# Altium footprint library texas.PCBLIB: 168 footprints (part 2 of 14)
Each footprint in its own frame and in the unit in brackets; x right, y up, seen from the top. Pads: shape width x height; smd on the part's side, far side on the other; paste and mask are expansions set on the pad; w line width, h text height; cw(c..) or ccw(c..) is an arc to the next point about the centre after c.
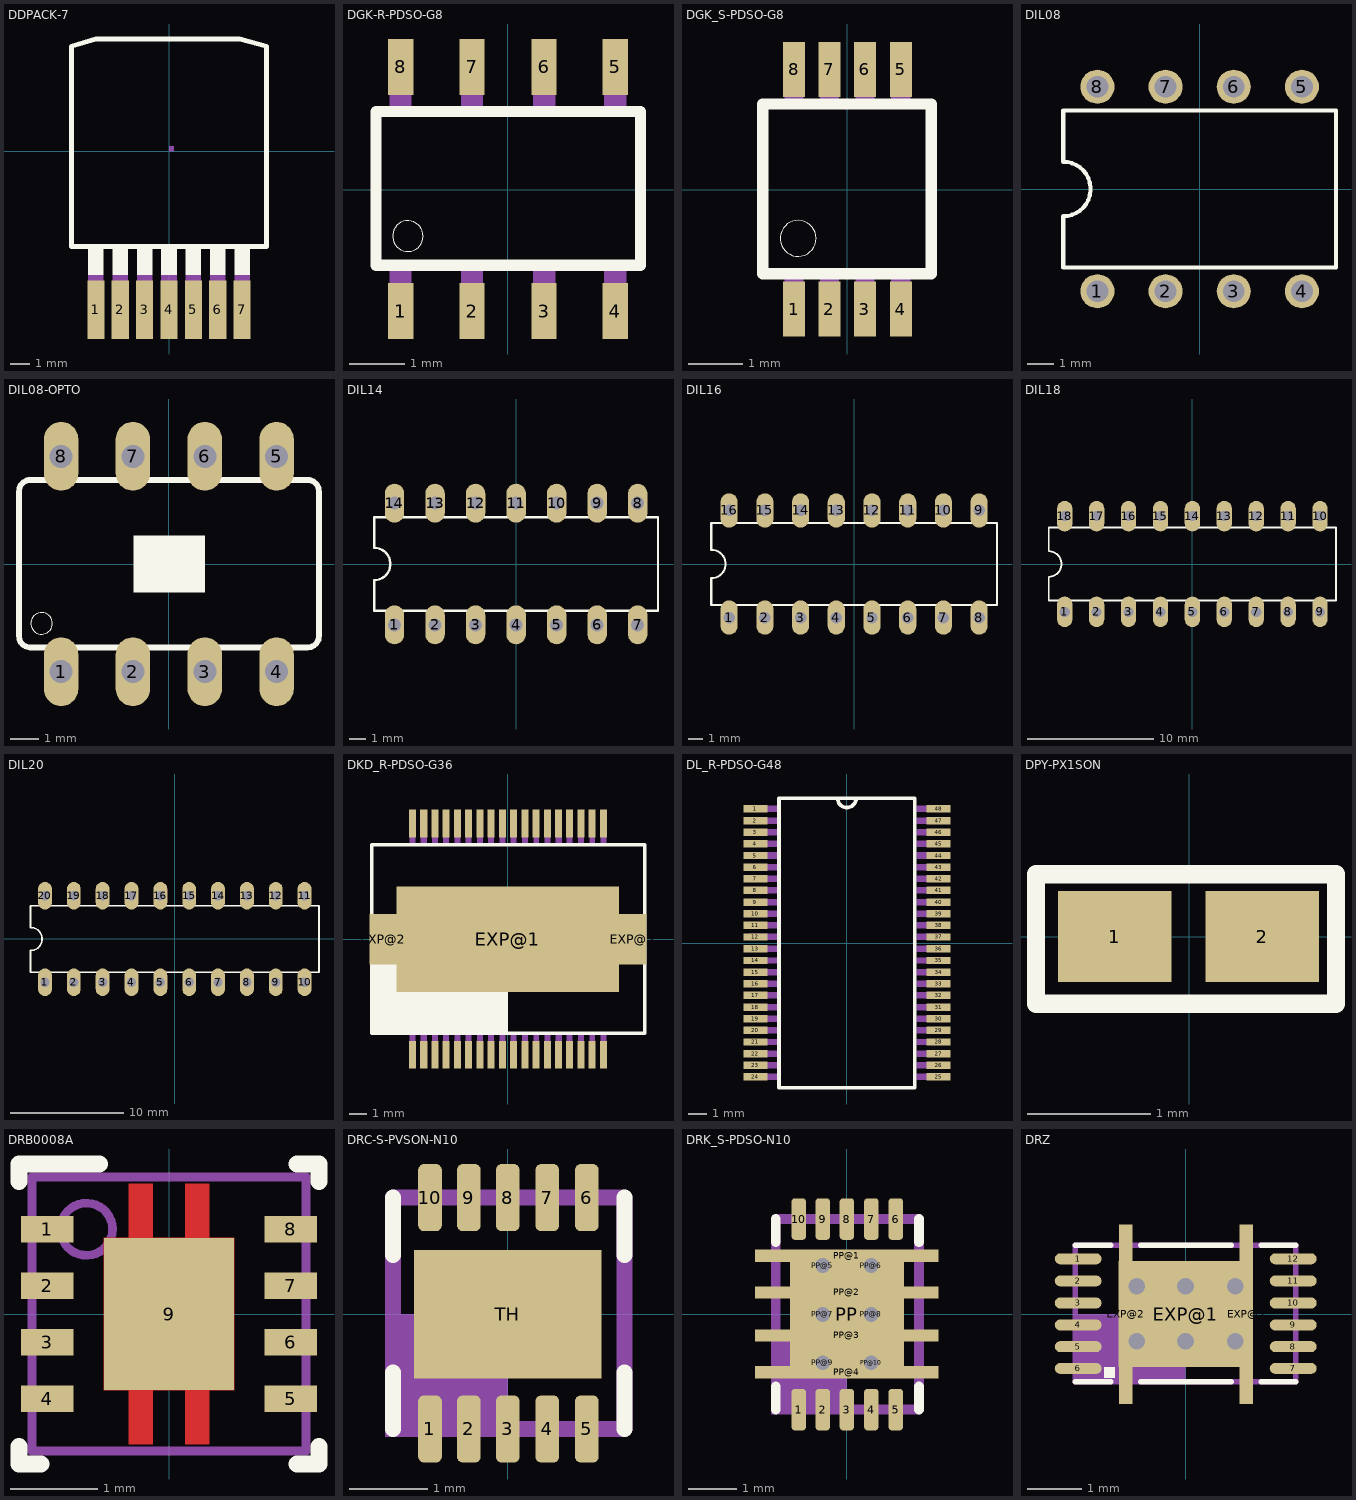
[diagram p1: the footprints below, top view; thin cyan lines are the x and y axes]

## DDPACK-7 [mil]
pads (7):
  rect 35x120 smd: 1(-150,-325) 2(-100,-325) 3(-50,-325) 4(0,-325) 5(50,-325) 6(100,-325) 7(150,-325)
Top Overlay:
  rectangle: 134,-254 166,-198
  rectangle: 84,-254 116,-198
  rectangle: 34,-254 66,-198
  rectangle: -16,-254 16,-198
  rectangle: -66,-254 -34,-198
  rectangle: -116,-254 -84,-198
  rectangle: -166,-254 -134,-198
  lines w10: -200,-195 200,-195 200,215 145,230 -150,230 -200,215 -200,-195
Mechanical 4:
  rectangle: 134,-372 166,-254
  rectangle: 84,-372 116,-254
  rectangle: 34,-372 66,-254
  rectangle: -16,-372 16,-254
  rectangle: -66,-372 -34,-254
  rectangle: -116,-372 -84,-254
  rectangle: -166,-372 -134,-254
Mechanical 14:
  region: 0,0 10,0 10,10 0,10

## DGK-R-PDSO-G8 [mil]
pads (8):
  rect 18x40 smd: 1(-76.77,-87.01) 2(-25.59,-87.01) 3(26,-87.01) 4(77,-87.01) 5(77,88) 6(26,88) 7(-25.59,88) 8(-76.77,88)
Top Overlay:
  circle w0: c-71.65,-33.27 r11
  lines w8: 95,55 95,-54.13 -94.49,-54.13 -94.49,56 95,56
Mechanical 4:
  rectangle: -84.65,-100.39 -68.9,-56.3
  rectangle: -33.46,-100.39 -17.72,-56.3
  rectangle: 18,-100.39 34,-56.3
  rectangle: 69,-100.39 85,-56.3
  region: 85,101 69,101 69,57 85,57
  region: 34,101 18,101 18,57 34,57
  region: -17.72,101 -33.46,101 -33.46,57 -17.72,57
  region: -68.9,101 -84.65,101 -84.65,57 -68.9,57

## DGK_S-PDSO-G8 [mil]
pads (8):
  rect 16x40 smd: 1(-38.39,-86.61) 2(-12.8,-86.61) 3(13,-86.61) 4(39,-86.61) 5(39,87) 6(13,87) 7(-12.8,87) 8(-38.39,87)
Top Overlay:
  circle w0: c-35.43,-35.43 r13
  lines w8: -61.02,-61.02 -61.02,62 61,62 61,-61.02 -61.02,-61.02
Top Solder:
  region: -29.53,109 -47.24,109 -47.24,65 -29.53,65
  region: -3.94,109 -21.65,109 -21.65,65 -3.94,65
  region: 22,109 4,109 4,65 22,65
  region: 48,109 30,109 30,65 48,65
  rectangle: 30,-108.27 48,-64.96
  rectangle: 4,-108.27 22,-64.96
  rectangle: -21.65,-108.27 -3.94,-64.96
  rectangle: -47.24,-108.27 -29.53,-64.96
Mechanical 4:
  region: -31.5,99 -45.28,99 -45.28,64 -31.5,64
  region: -5.91,99 -19.68,99 -19.69,64 -5.91,64
  region: 20,99 6,99 6,64 20,64
  region: 46,99 32,99 32,64 46,64
  rectangle: 32,-98.43 46,-63.98
  rectangle: 6,-98.43 20,-63.98
  rectangle: -19.68,-98.43 -5.91,-63.98
  rectangle: -45.28,-98.43 -31.5,-63.98

## DIL08 [mil]
pads (8):
  round 50 hole 32: 1(-150,-150) 2(-50,-150) 3(50,-150) 4(150,-150) 5(150,150) 6(50,150) 7(-50,150) 8(-150,150)
Top Overlay:
  lines w6: -200,-115 -200,-40 ccw(c-200,0) -200,40 -200,115 200,115 200,-115 -200,-115

## DIL08-OPTO [mil]
pads (8):
  oval 48x96 hole 32: 1(-150,-150) 2(-50,-150) 3(50,-150) 4(150,-150) 5(150,150) 6(50,150) 7(-50,150) 8(-150,150)
Top Overlay:
  circle w0: c-177.17,-82.68 r15
  circle w0: c0,-1.97 r1
  rectangle: -49.21,-39.37 50,40
  lines w8: -208.66,-100.39 ccw(c-192.91,-100.39) -192.91,-116.14 193,-116.14 ccw(c193.13,-100.27) 209,-100.39 209,101 ccw(c193,101) 193,117 -192.91,117 ccw(c-192.79,101.13) -208.66,101 -208.66,-100.39

## DIL14 [mil]
pads (14):
  oval 48x96 hole 32: 1(-300,-150) 2(-200,-150) 3(-100,-150) 4(0,-150) 5(100,-150) 6(200,-150) 7(300,-150) 8(300,150) 9(200,150) 10(100,150) 11(0,150) 12(-100,150) 13(-200,150) 14(-300,150)
Top Overlay:
  lines w6: -350,-115 -350,-40 ccw(c-350,0) -350,40 -350,115 350,115 350,-115 -350,-115

## DIL16 [mil]
pads (16):
  oval 48x96 hole 32: 1(-350,-150) 2(-250,-150) 3(-150,-150) 4(-50,-150) 5(50,-150) 6(150,-150) 7(250,-150) 8(350,-150) 9(350,150) 10(250,150) 11(150,150) 12(50,150) 13(-50,150) 14(-150,150) 15(-250,150) 16(-350,150)
Top Overlay:
  lines w6: -400,-115 400,-115 400,115 -400,115 -400,40 cw(c-400,0) -400,-40 -400,-115
3D body "SW3DPS-DIP16-DEFAULT.STEP": height 165, standoff -101, extent -425,-155 425,155

## DIL18 [mil]
pads (18):
  oval 48x96 hole 32: 1(-400,-150) 2(-300,-150) 3(-200,-150) 4(-100,-150) 5(0,-150) 6(100,-150) 7(200,-150) 8(300,-150) 9(400,-150) 10(400,150) 11(300,150) 12(200,150) 13(100,150) 14(0,150) 15(-100,150) 16(-200,150) 17(-300,150) 18(-400,150)
Top Overlay:
  lines w6: -450,-115 -450,-40 ccw(c-450,0) -450,40 -450,115 450,115 450,-115 -450,-115

## DIL20 [mil]
pads (20):
  oval 48x96 hole 32: 1(-450,-150) 2(-350,-150) 3(-250,-150) 4(-150,-150) 5(-50,-150) 6(50,-150) 7(150,-150) 8(250,-150) 9(350,-150) 10(450,-150) 11(450,150) 12(350,150) 13(250,150) 14(150,150) 15(50,150) 16(-50,150) 17(-150,150) 18(-250,150) 19(-350,150) 20(-450,150)
Top Overlay:
  lines w6: -500,-115 500,-115 500,115 -500,115 -500,40 cw(c-500,0) -500,-40 -500,-115

## DKD_R-PDSO-G36 [mil]
pads (39):
  rect 16x63 smd: 1(-217.52,-263.78) 2(-191.93,-263.78) 3(-166.34,-263.78) 4(-140.75,-263.78) 5(-115.16,-263.78) 6(-89.57,-263.78) 7(-63.98,-263.78) 8(-38.39,-263.78) 9(-12.8,-263.78) 10(13,-263.78) 11(39,-263.78) 12(64,-263.78) 13(90,-263.78) 14(116,-263.78) 15(141,-263.78) 16(167,-263.78) 17(192,-263.78) 18(218,-263.78) 19(218,264) 20(192,264) 21(167,264) 22(141,264) 23(116,264) 24(90,264) 25(64,264) 26(39,264) 27(13,264) 28(-12.8,264) 29(-38.39,264) 30(-63.98,264) 31(-89.57,264) 32(-115.16,264) 33(-140.75,264) 34(-166.34,264) 35(-191.93,264) 36(-217.52,264)
  rect 508x241 smd: EXP@1(0,0)
  rect 63x115 smd: EXP@2(-284.45,0) EXP@3(285,0)
Top Overlay:
  rectangle: -311.02,-213.58 0,0
  lines w8: -311.02,-214.57 312,-214.57 312,215 -311.02,215 -311.02,-214.57
Top Solder:
  rectangle: -227.36,-297.24 -207.68,-230.31
  rectangle: -201.77,-297.24 -182.09,-230.31
  rectangle: -176.18,-297.24 -156.5,-230.31
  rectangle: -150.59,-297.24 -130.91,-230.31
  rectangle: -125,-297.24 -105.31,-230.31
  rectangle: -99.41,-297.24 -79.72,-230.31
  rectangle: -73.82,-297.24 -54.13,-230.31
  rectangle: -48.23,-297.24 -28.54,-230.31
  rectangle: -22.64,-297.24 -2.95,-230.31
  rectangle: 3,-297.24 23,-230.31
  rectangle: 29,-297.24 49,-230.31
  rectangle: 55,-297.24 74,-230.31
  rectangle: 80,-297.24 100,-230.31
  rectangle: 106,-297.24 125,-230.31
  rectangle: 131,-297.24 151,-230.31
  rectangle: 157,-297.24 177,-230.31
  rectangle: 183,-297.24 202,-230.31
  rectangle: 208,-297.24 228,-230.31
  region: 228,298 208,298 208,231 228,231
  region: 202,298 183,298 183,231 202,231
  region: 177,298 157,298 157,231 177,231
  region: 151,298 131,298 131,231 151,231
  region: 125,298 106,298 106,231 125,231
  region: 100,298 80,298 80,231 100,231
  region: 74,298 55,298 55,231 74,231
  region: 49,298 29,298 29,231 49,231
  region: 23,298 3,298 3,231 23,231
  region: -2.95,298 -22.64,298 -22.64,231 -2.95,231
  region: -28.54,298 -48.23,298 -48.23,231 -28.54,231
  region: -54.13,298 -73.82,298 -73.82,231 -54.13,231
  region: -79.72,298 -99.41,298 -99.41,231 -79.72,231
  region: -105.31,298 -125,298 -125,231 -105.31,231
  region: -130.91,298 -150.59,298 -150.59,231 -130.91,231
  region: -156.5,298 -176.18,298 -176.18,231 -156.5,231
  region: -182.09,298 -201.77,298 -201.77,231 -182.09,231
  region: -207.68,298 -227.36,298 -227.36,231 -207.68,231
Mechanical 4:
  rectangle: -224.41,-285.43 -210.63,-217.52
  rectangle: -198.82,-285.43 -185.04,-217.52
  rectangle: -173.23,-285.43 -159.45,-217.52
  rectangle: -147.64,-285.43 -133.86,-217.52
  rectangle: -122.05,-285.43 -108.27,-217.52
  rectangle: -96.46,-285.43 -82.68,-217.52
  rectangle: -70.87,-285.43 -57.09,-217.52
  rectangle: -45.28,-285.43 -31.5,-217.52
  rectangle: -19.68,-285.43 -5.91,-217.52
  rectangle: 6,-285.43 20,-217.52
  rectangle: 32,-285.43 46,-217.52
  rectangle: 58,-285.43 71,-217.52
  rectangle: 83,-285.43 97,-217.52
  rectangle: 109,-285.43 123,-217.52
  rectangle: 134,-285.43 148,-217.52
  rectangle: 160,-285.43 174,-217.52
  rectangle: 186,-285.43 199,-217.52
  rectangle: 211,-285.43 225,-217.52
  region: -82.68,286 -96.46,286 -96.46,218 -82.68,218
  region: -108.27,286 -122.05,286 -122.05,218 -108.27,218
  region: -133.86,286 -147.64,286 -147.64,218 -133.86,218
  region: -159.45,286 -173.23,286 -173.23,218 -159.45,218
  region: -185.04,286 -198.82,286 -198.82,218 -185.04,218
  region: -210.63,286 -224.41,286 -224.41,218 -210.63,218
  region: 71,286 58,286 58,218 71,218
  region: 46,286 32,286 32,218 46,218
  region: 20,286 6,286 6,218 20,218
  region: -5.91,286 -19.68,286 -19.69,218 -5.91,218
  region: -31.5,286 -45.28,286 -45.28,218 -31.5,218
  region: -57.09,286 -70.87,286 -70.87,218 -57.09,218
  region: 225,286 211,286 211,218 225,218
  region: 199,286 186,286 186,218 199,218
  region: 174,286 160,286 160,218 174,218
  region: 148,286 134,286 134,218 148,218
  region: 123,286 109,286 109,218 123,218
  region: 97,286 83,286 83,218 97,218

## DL_R-PDSO-G48 [mil]
pads (48):
  rect 52x16 smd: 1(-196.06,288) 2(-196.06,263) 3(-196.06,238) 4(-196.06,213) 5(-196.06,188) 6(-196.06,163) 7(-196.06,138) 8(-196.06,113) 9(-196.06,88) 10(-196.06,63) 11(-196.06,38) 12(-196.06,13) 13(-196.06,-12.5) 14(-196.06,-37.5) 15(-196.06,-62.5) 16(-196.06,-87.5) 17(-196.06,-112.5) 18(-196.06,-137.5) 19(-196.06,-162.5) 20(-196.06,-187.5) 21(-196.06,-212.5) 22(-196.06,-237.5) 23(-196.06,-262.5) 24(-196.06,-287.5) 25(197,-287.5) 26(197,-262.5) 27(197,-237.5) 28(197,-212.5) 29(197,-187.5) 30(197,-162.5) 31(197,-137.5) 32(197,-112.5) 33(197,-87.5) 34(197,-62.5) 35(197,-37.5) 36(197,-12.5) 37(197,13) 38(197,38) 39(197,63) 40(197,88) 41(197,113) 42(197,138) 43(197,163) 44(197,188) 45(197,213) 46(197,238) 47(197,263) 48(197,288)
Top Overlay:
  lines w8: -19.69,311 ccw(c0.16,311) 20,311 ; -145.61,-310.96 146,-310.96 146,311 -145.61,311 -145.61,-310.96
Mechanical 4:
  rectangle: -209.84,281 -149.61,295
  rectangle: -209.84,256 -149.61,270
  rectangle: -209.84,231 -149.61,245
  rectangle: -209.84,206 -149.61,220
  rectangle: -209.84,181 -149.61,195
  rectangle: -209.84,156 -149.61,170
  rectangle: -209.84,131 -149.61,145
  rectangle: -209.84,106 -149.61,120
  rectangle: -209.84,81 -149.61,95
  rectangle: -209.84,56 -149.61,70
  rectangle: -209.84,31 -149.61,45
  rectangle: -209.84,6 -149.61,20
  rectangle: -209.84,-19.39 -149.61,-5.61
  rectangle: -209.84,-44.39 -149.61,-30.61
  rectangle: -209.84,-69.39 -149.61,-55.61
  rectangle: -209.84,-94.39 -149.61,-80.61
  rectangle: -209.84,-119.39 -149.61,-105.61
  rectangle: -209.84,-144.39 -149.61,-130.61
  rectangle: -209.84,-169.39 -149.61,-155.61
  rectangle: -209.84,-194.39 -149.61,-180.61
  rectangle: -209.84,-219.39 -149.61,-205.61
  rectangle: -209.84,-244.39 -149.61,-230.61
  rectangle: -209.84,-269.39 -149.61,-255.61
  rectangle: -209.84,-294.39 -149.61,-280.61
  rectangle: 150,-294.39 210,-280.61
  rectangle: 150,-269.39 210,-255.61
  rectangle: 150,-244.39 210,-230.61
  rectangle: 150,-219.39 210,-205.61
  rectangle: 150,-194.39 210,-180.61
  rectangle: 150,-169.39 210,-155.61
  rectangle: 150,-144.39 210,-130.61
  rectangle: 150,-119.39 210,-105.61
  rectangle: 150,-94.39 210,-80.61
  rectangle: 150,-69.39 210,-55.61
  rectangle: 150,-44.39 210,-30.61
  rectangle: 150,-19.39 210,-5.61
  rectangle: 150,6 210,20
  rectangle: 150,31 210,45
  rectangle: 150,56 210,70
  rectangle: 150,81 210,95
  rectangle: 150,106 210,120
  rectangle: 150,131 210,145
  rectangle: 150,156 210,170
  rectangle: 150,181 210,195
  rectangle: 150,206 210,220
  rectangle: 150,231 210,245
  rectangle: 150,256 210,270
  rectangle: 150,281 210,295

## DPY-PX1SON [mm]
pads (2):
  rect 0.925x0.74 smd: 1(-0.605,0) 2(0.595,0)
Top Overlay:
  lines w0.15: -1.245,-0.547 -1.245,0.508 1.194,0.508 1.194,-0.547 0.127,-0.547 -1.245,-0.547
3D body "User Library-R_0402.step": height 0.35, standoff 0, extent -0.5,-0.25 0.5,0.25

## DRB0008A [mm]
pads (9):
  rect 0.6x0.3 smd paste+0 mask+0.051: 1(-1.4,0.975) 2(-1.4,0.325) 3(-1.4,-0.325) 4(-1.4,-0.975) 5(1.4,-0.975) 6(1.4,-0.325) 7(1.4,0.325) 8(1.4,0.975)
  rect 1.5x1.75 smd paste-0.862 mask+0.051: 9(0,0)
Top Layer:
  region: -0.185,-1.5 -0.465,-1.5 -0.465,-0.875 -0.75,-0.875 -0.75,0.875 -0.465,0.875 -0.465,1.5 -0.185,1.5 -0.185,0.875 0.185,0.875 0.185,1.5 0.465,1.5 0.465,0.875 0.75,0.875 0.75,-0.875 0.465,-0.875 0.465,-1.5 0.185,-1.5 0.185,-0.875 -0.185,-0.875
Top Overlay:
  lines w0.2: -1.725,-1.525 -1.725,-1.725 -1.475,-1.725 ; -1.725,1.525 -1.725,1.725 -0.8,1.725 ; 1.475,-1.725 1.725,-1.725 1.725,-1.525 ; 1.475,1.725 1.725,1.725 1.725,1.525
Top Paste:
  region: -0.691,0.793 -0.691,-0.793 0.692,-0.793 0.692,0.793
Top Solder:
  region: -0.185,-1.551 -0.465,-1.551 -0.475,-1.55 -0.484,-1.547 -0.493,-1.542 -0.501,-1.536 -0.507,-1.528 -0.512,-1.519 -0.515,-1.51 -0.516,-1.5 -0.516,-0.926 -0.75,-0.926 -0.76,-0.925 -0.769,-0.922 -0.778,-0.917 -0.786,-0.911 -0.792,-0.903 -0.797,-0.894 -0.8,-0.885 -0.801,-0.875 -0.801,0.875 -0.8,0.885 -0.797,0.894 -0.792,0.903 -0.786,0.911 -0.778,0.917 -0.769,0.922 -0.76,0.925 -0.75,0.926 -0.516,0.926 -0.516,1.5 -0.515,1.51 -0.512,1.519 -0.507,1.528 -0.501,1.536 -0.493,1.542 -0.484,1.547 -0.475,1.55 -0.465,1.551 -0.185,1.551 -0.175,1.55 -0.166,1.547 -0.157,1.542 -0.149,1.536 -0.143,1.528 -0.138,1.519 -0.135,1.51 -0.134,1.5 -0.134,0.926 0.134,0.926 0.134,1.5 0.135,1.51 0.138,1.519 0.143,1.528 0.149,1.536 0.157,1.542 0.166,1.547 0.175,1.55 0.185,1.551 0.465,1.551 0.475,1.55 0.484,1.547 0.493,1.542 0.501,1.536 0.507,1.528 0.512,1.519 0.515,1.51 0.516,1.5 0.516,0.926 0.75,0.926 0.76,0.925 0.769,0.922 0.778,0.917 0.786,0.911 0.792,0.903 0.797,0.894 0.8,0.885 0.801,0.875 0.801,-0.875 0.8,-0.885 0.797,-0.894 0.792,-0.903 0.786,-0.911 0.778,-0.917 0.769,-0.922 0.76,-0.925 0.75,-0.926 0.516,-0.926 0.516,-1.5 0.515,-1.51 0.512,-1.519 0.507,-1.528 0.501,-1.536 0.493,-1.542 0.484,-1.547 0.475,-1.55 0.465,-1.551 0.185,-1.551 0.175,-1.55 0.166,-1.547 0.157,-1.542 0.149,-1.536 0.143,-1.528 0.138,-1.519 0.135,-1.51 0.134,-1.5 0.134,-0.926 -0.134,-0.926 -0.134,-1.5 -0.135,-1.51 -0.138,-1.519 -0.143,-1.528 -0.149,-1.536 -0.157,-1.542 -0.166,-1.547 -0.175,-1.55
Mechanical 13:
  circle w0.1: c-0.95,0.975 r0.3
  lines w0.1: -1.575,-1.575 1.575,-1.575 1.575,1.575 -1.575,1.575 -1.575,-1.575
3D body: height 0.25, standoff 0, extent 0,0 0.254,0.254
3D body "User Library-DRB(S-PVSON-N8).STEP": height 1, standoff -0.05, extent -1.52,-1.524 1.52,1.516

## DRC-S-PVSON-N10 [mil]
pads (11):
  rrect50% 12x34 smd: 1(-39.37,-58.07) 2(-19.68,-58.07) 3(0,-58.07) 4(20,-58.07) 5(40,-58.07) 6(40,59) 7(20,59) 8(0,59) 9(-19.68,59) 10(-39.37,59)
  rect 95x65 smd: TH(0,0)
Top Layer:
  region: 0,0 10,0 10,10 0,10
Top Overlay:
  lines w8: -58.07,-58.07 -58.07,-29.43 ; -58.07,30 -58.07,59 ; 59,-58.07 59,-29.43 ; 59,30 59,59
Top Paste:
  circle w0: c-39.37,46 r5
  circle w0: c-19.68,46 r5
  circle w0: c0,46 r5
  circle w0: c20,46 r5
  circle w0: c40,46 r5
  circle w0: c40,-45.87 r5
  circle w0: c20,-45.87 r5
  circle w0: c0,-45.87 r5
  circle w0: c-19.68,-45.87 r5
  circle w0: c-39.37,-45.87 r5
  region: 75,16 53,16 53,6 75,6
  region: 75,-5.91 53,-5.91 53,-15.75 75,-15.75
  region: -43.87,72.98 -43.87,46.02 -34.87,46.02 -34.87,72.98
  region: -24.19,72.98 -24.19,46.02 -15.19,46.02 -15.19,72.98
  region: -4.24,73.24 -4.24,45.76 4.76,45.76 4.76,73.24
  region: 16,73 16,46 25,46 25,73
  region: 35,73 35,46 44,46 44,73
  region: 44.03,-72.85 44.03,-45.85 34.97,-45.85 34.97,-72.85
  region: 25.03,-72.85 25.03,-45.85 15.97,-45.85 15.97,-72.85
  region: 4.79,-73.09 4.79,-45.61 -4.27,-45.61 -4.27,-73.09
  region: -15.16,-72.83 -15.16,-45.87 -24.21,-45.87 -24.21,-72.83
  region: -34.84,-72.83 -34.84,-45.87 -43.9,-45.87 -43.9,-72.83
  region: 47,32 6,32 6,6 47,6
  region: 47,-5.91 6,-5.91 6,-31.5 47,-31.5
  rectangle: -46.26,-31.5 -5.91,-5.91
  rectangle: -46.26,6 -5.91,32
  rectangle: -74.8,-15.75 -52.17,-5.91
  rectangle: -74.8,6 -52.17,16
Top Solder:
  circle w0: c-39.37,46 r7
  circle w0: c-19.68,46 r7
  circle w0: c0,46 r7
  circle w0: c20,46 r7
  circle w0: c40,46 r7
  circle w0: c40,-45.87 r7
  circle w0: c20,-45.87 r7
  circle w0: c0,-45.87 r7
  circle w0: c-19.68,-45.87 r7
  circle w0: c-39.37,-45.87 r7
  region: 76,17 53,17 53,5 76,5
  region: 76,-4.92 53,-4.92 53,-16.73 76,-16.73
  region: -32.48,76 -46.26,76 -46.26,46 -32.48,46
  region: -12.8,76 -26.57,76 -26.57,46 -12.8,46
  region: 7,76 -6.89,76 -6.89,46 7,46
  region: 27,76 13,76 13,46 27,46
  region: 47,76 33,76 33,46 47,46
  rectangle: 33,-75.79 47,-45.87
  rectangle: 13,-75.79 27,-45.87
  rectangle: -6.89,-75.79 7,-45.87
  rectangle: -26.57,-75.79 -12.8,-45.87
  rectangle: -46.26,-75.79 -32.48,-45.87
  rectangle: -48.23,-33.46 49,34
  rectangle: -75.79,-16.73 -52.17,-4.92
  rectangle: -75.79,5 -52.17,17
Mechanical 4:
  rectangle: -62.01,-62.01 0,0
  lines w8: -58.07,-58.07 -58.07,59 59,59 59,-58.07 -58.07,-58.07

## DRK_S-PDSO-N10 [mil]
pads (21):
  rrect50% 12x34 smd: 1(-39.37,-77.76) 2(-19.68,-77.76) 3(0,-77.76) 4(20,-77.76) 5(40,-77.76) 6(40,78) 7(20,78) 8(0,78) 9(-19.68,78) 10(-39.37,78)
  rect 93x105 smd: PP(0,0)
  rect 150x10 smd: PP@1(0,48) PP@2(0,18) PP@3(0,-17.13) PP@4(0,-47.24)
  round 20 hole 12: PP@5(-19.68,40) PP@6(20,40) PP@7(-19.68,0) PP@8(20,0) PP@9(-19.68,-39.37) PP@10(20,-39.37)
Top Overlay:
  lines w8: -58.07,-77.76 -58.07,-58.96 ; -58.07,59 -58.07,78 ; 59,-77.76 59,-58.96 ; 59,59 59,78
Top Paste:
  circle w0: c-39.37,66 r5
  circle w0: c-19.68,66 r5
  circle w0: c0,66 r5
  circle w0: c20,66 r5
  circle w0: c40,66 r5
  circle w0: c40,-65.55 r5
  circle w0: c20,-65.55 r5
  circle w0: c0,-65.55 r5
  circle w0: c-19.68,-65.55 r5
  circle w0: c-39.37,-65.55 r5
  region: -3.94,-3.94 -39.37,-3.94 -39.37,-51.18 -3.94,-51.18
  rectangle: 4,4 40,52
  region: 40,-3.94 4,-3.94 4,-51.18 40,-51.18
  region: 75,22 53,22 53,13 75,13
  region: 75,53 53,53 53,43 75,43
  region: 75,-12.8 53,-12.8 53,-21.65 75,-21.65
  region: 75,-42.32 53,-42.32 53,-52.17 75,-52.17
  rectangle: -74.8,-21.65 -52.17,-12.8
  rectangle: -74.8,-52.17 -52.17,-42.32
  region: -43.87,92.98 -43.87,66.02 -34.87,66.02 -34.87,92.98
  region: -24.19,92.98 -24.19,66.02 -15.19,66.02 -15.19,92.98
  region: -4.24,93.24 -4.24,65.76 4.76,65.76 4.76,93.24
  region: 16,93 16,66 25,66 25,93
  region: 35,93 35,66 44,66 44,93
  region: 44.03,-92.54 44.03,-65.54 34.97,-65.54 34.97,-92.54
  region: 25.03,-92.54 25.03,-65.54 15.97,-65.54 15.97,-92.54
  region: 4.79,-92.78 4.79,-65.29 -4.27,-65.29 -4.27,-92.78
  region: -15.16,-92.52 -15.16,-65.55 -24.21,-65.55 -24.21,-92.52
  region: -34.84,-92.52 -34.84,-65.55 -43.9,-65.55 -43.9,-92.52
  rectangle: -39.37,4 -3.94,52
  rectangle: -74.8,13 -52.17,22
  rectangle: -74.8,43 -52.17,53
Top Solder:
  circle w0: c-39.37,66 r7
  circle w0: c-19.68,66 r7
  circle w0: c0,66 r7
  circle w0: c20,66 r7
  circle w0: c40,66 r7
  circle w0: c40,-65.55 r7
  circle w0: c20,-65.55 r7
  circle w0: c0,-65.55 r7
  circle w0: c-19.68,-65.55 r7
  circle w0: c-39.37,-65.55 r7
  region: 76,24 47,24 47,11 76,11
  region: 76,54 47,54 47,42 76,42
  region: 76,-10.83 47,-10.83 47,-23.62 76,-23.62
  region: 76,-41.34 47,-41.34 47,-53.15 76,-53.15
  rectangle: -75.79,-23.62 -46.26,-10.83
  rectangle: -75.79,-53.15 -46.26,-41.34
  region: -32.48,96 -46.26,96 -46.26,66 -32.48,66
  region: -12.8,96 -26.57,96 -26.57,66 -12.8,66
  region: 7,96 -6.89,96 -6.89,66 7,66
  region: 27,96 13,96 13,66 27,66
  region: 47,96 33,96 33,66 47,66
  rectangle: 33,-95.47 47,-65.55
  rectangle: 13,-95.47 27,-65.55
  rectangle: -6.89,-95.47 7,-65.55
  rectangle: -26.57,-95.47 -12.8,-65.55
  rectangle: -46.26,-95.47 -32.48,-65.55
  rectangle: -48.23,-54.13 49,55
  rectangle: -75.79,11 -46.26,24
  rectangle: -75.79,42 -46.26,54
Mechanical 4:
  rectangle: -62.01,-81.69 0,-19.68
  lines w8: -58.07,-77.76 -58.07,78 59,78 59,-77.76 -58.07,-77.76

## DRZ [mil]
pads (21):
  rrect100% 34x8 smd: 1(-77.76,40) 2(-77.76,24) 3(-77.76,8) 4(-77.76,-7.87) 5(-77.76,-23.62) 6(-77.76,-39.37) 7(78,-39.37) 8(78,-23.62) 9(78,-7.87) 10(78,8) 11(78,24) 12(78,40)
  rect 97x77 smd: EXP@1(0,0)
  rect 10x130 smd: EXP@2(-43.31,0) EXP@3(44,0)
  round 16 hole 12: EXP@4(-35.43,20) EXP@5(0,20) EXP@6(36,20) EXP@7(-35.43,-19.68) EXP@8(0,-19.68) EXP@9(36,-19.68)
Top Overlay:
  rectangle: -59.06,-46.26 -51.18,-38.39
  lines w4: -79.72,-49.21 -54.13,-49.21 ; -79.72,50 -54.13,50 ; -32.48,-49.21 33,-49.21 ; -32.48,50 33,50 ; 55,-49.21 80,-49.21 ; 55,50 80,50
Top Paste:
  circle w0: c-64.96,40 r3
  circle w0: c-64.96,24 r3
  circle w0: c-64.96,8 r3
  circle w0: c-64.96,-7.87 r3
  circle w0: c-64.96,-23.62 r3
  circle w0: c-64.96,-39.37 r3
  circle w0: c65,-39.37 r3
  circle w0: c65,-23.62 r3
  circle w0: c65,-7.87 r3
  circle w0: c65,8 r3
  circle w0: c65,24 r3
  circle w0: c65,40 r3
  rectangle: -91.54,37 -64.96,43
  rectangle: -91.54,21 -64.96,27
  rectangle: -91.54,5 -64.96,11
  rectangle: -91.54,-10.83 -64.96,-4.92
  rectangle: -91.54,-26.57 -64.96,-20.67
  rectangle: -91.54,-42.32 -64.96,-36.42
  region: 92,-36.42 65,-36.42 65,-42.32 92,-42.32
  region: 92,-20.67 65,-20.67 65,-26.57 92,-26.57
  region: 92,-4.92 65,-4.92 65,-10.83 92,-10.83
  region: 92,11 65,11 65,5 92,5
  region: 92,27 65,27 65,21 92,21
  region: 92,43 65,43 65,37 92,37
  rectangle: -43.31,4 -3.94,36
  rectangle: 4,4 44,36
  rectangle: -43.31,-35.43 -3.94,-3.94
  rectangle: 4,-35.43 44,-3.94
  rectangle: -48.23,44 -38.39,64
  rectangle: 39,44 49,64
  rectangle: -48.23,-63.98 -38.39,-43.31
  rectangle: 39,-63.98 49,-43.31
Top Solder:
  circle w0: c-64.96,40 r5
  circle w0: c-64.96,24 r5
  circle w0: c-64.96,8 r5
  circle w0: c-64.96,-7.87 r5
  circle w0: c-64.96,-23.62 r5
  circle w0: c-64.96,-39.37 r5
  circle w0: c65,-39.37 r5
  circle w0: c65,-23.62 r5
  circle w0: c65,-7.87 r5
  circle w0: c65,8 r5
  circle w0: c65,24 r5
  circle w0: c65,40 r5
  rectangle: -92.52,35 -64.96,45
  rectangle: -92.52,19 -64.96,29
  rectangle: -92.52,3 -64.96,13
  rectangle: -92.52,-12.8 -64.96,-2.95
  rectangle: -92.52,-28.54 -64.96,-18.7
  rectangle: -92.52,-44.29 -64.96,-34.45
  region: 93,-34.45 65,-34.45 65,-44.29 93,-44.29
  region: 93,-18.7 65,-18.7 65,-28.54 93,-28.54
  region: 93,-2.95 65,-2.95 65,-12.8 93,-12.8
  region: 93,13 65,13 65,3 93,3
  region: 93,29 65,29 65,19 93,19
  region: 93,45 65,45 65,35 93,35
  rectangle: -49.21,-65.94 -37.4,66
  rectangle: 38,-65.94 50,66
  rectangle: -38.39,-39.37 39,40
Mechanical 4:
  rectangle: -78.74,-47.24 0,0
  lines w4: -79.72,-49.21 -79.72,50 80,50 80,-49.21 -79.72,-49.21